# Altium footprint library PCB贴片元件封装库.pcblib: 366 footprints (part 13 of 23)
Each footprint in its own frame and in the unit in brackets; x right, y up, seen from the top. Pads: shape width x height; smd on the part's side, far side on the other; paste and mask are expansions set on the pad; w line width, h text height; cw(c..) or ccw(c..) is an arc to the next point about the centre after c.
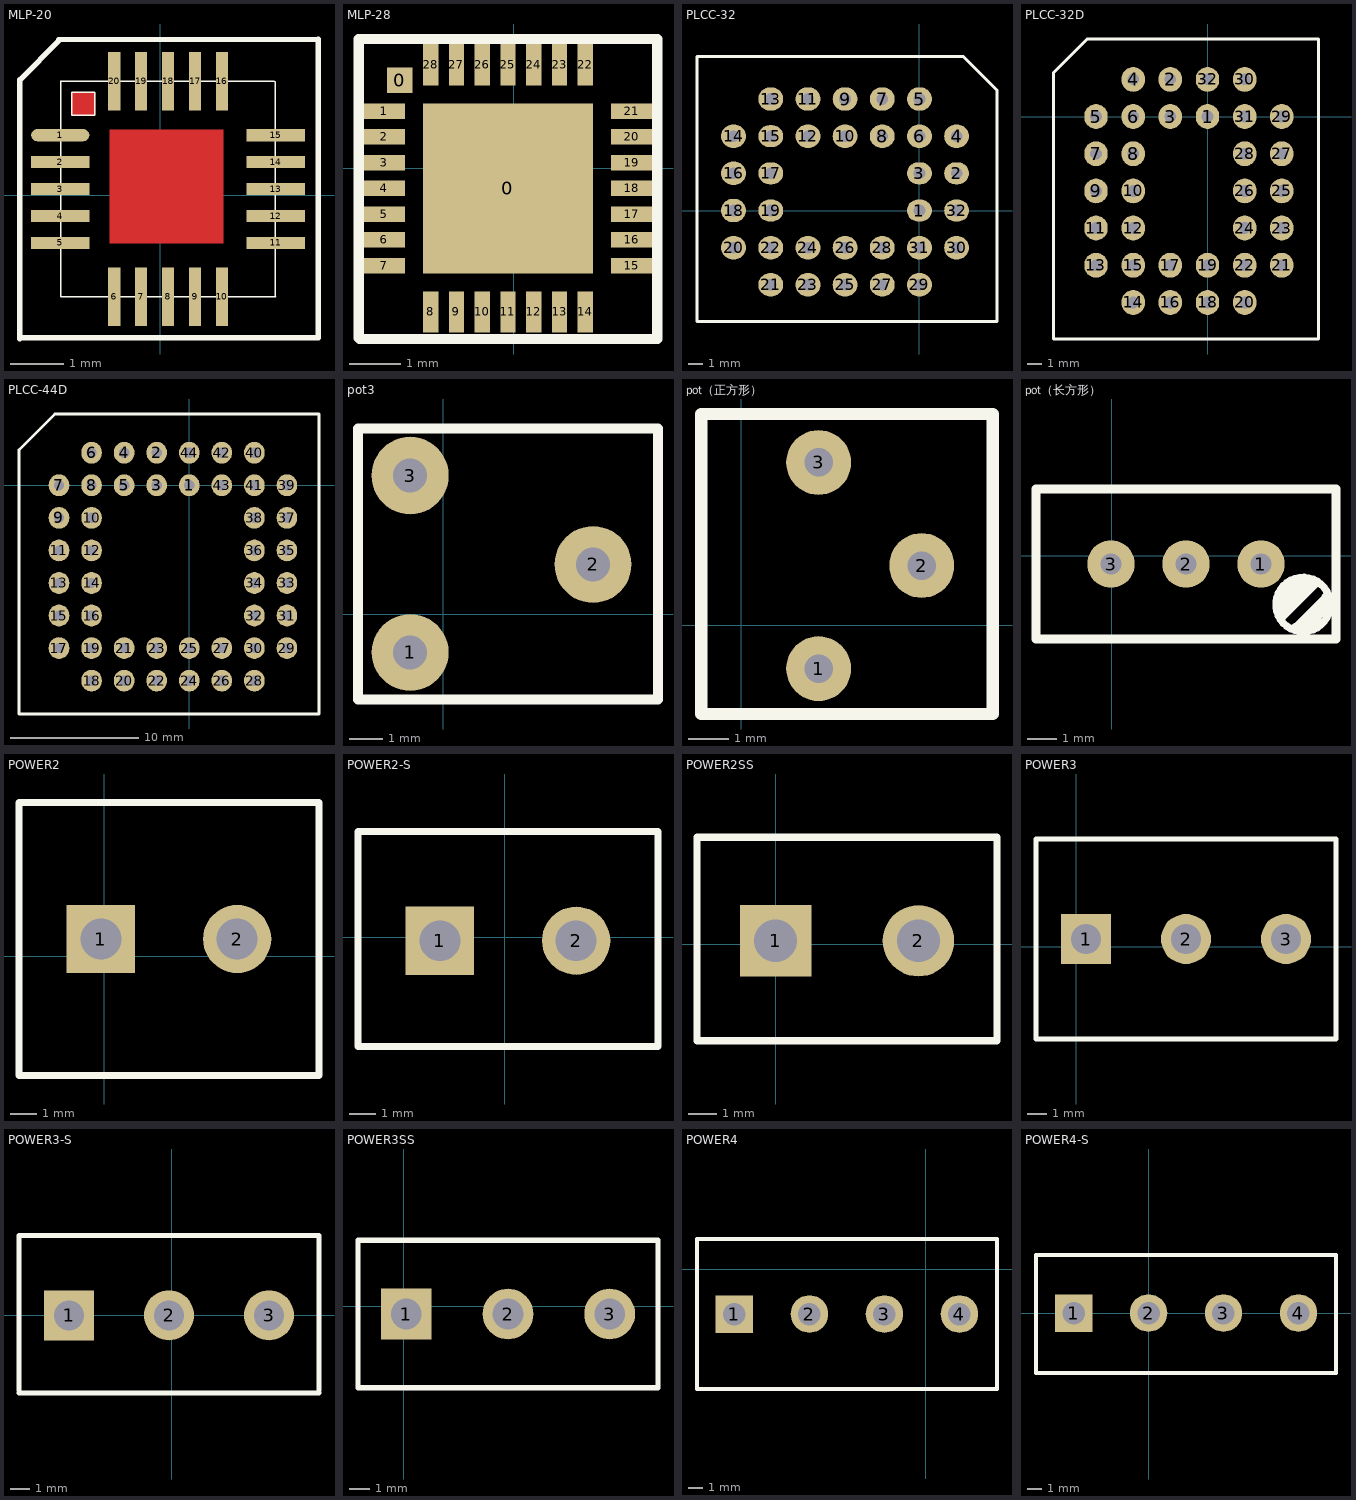
[diagram p12: the footprints below, top view; thin cyan lines are the x and y axes]

## MLP-20 [mm]
pads (20):
  oval 1.1x0.23 smd: 1(-1.88,1.137)
  rect 1.1x0.23 smd: 2(-1.88,0.629) 3(-1.88,0.121) 4(-1.88,-0.387) 5(-1.88,-0.895) 11(2.184,-0.895) 12(2.184,-0.387) 13(2.184,0.121) 14(2.184,0.629) 15(2.184,1.137)
  rect 0.23x1.1 smd: 6(-0.864,-1.911) 7(-0.356,-1.911) 8(0.152,-1.911) 9(0.66,-1.911) 10(1.168,-1.911) 16(1.168,2.153) 17(0.66,2.153) 18(0.152,2.153) 19(-0.356,2.153) 20(-0.864,2.153)
TopLayer:
  region: -0.954,1.241 -0.954,-0.909 1.196,-0.909 1.196,1.241
  rectangle: -1.677,1.518 -1.22,1.95
  lines w0.025: -2.642,-2.704 -2.621,-2.684 ; -1.894,2.929 -1.894,2.949 ; 2.97,2.939 2.981,2.949
TopOverlay:
  lines w0.025: -1.868,-1.907 -1.868,2.159 ; -1.862,-1.914 -1.859,-1.911 2.183,-1.911 2.17,-1.899 2.17,2.141 2.158,2.153 1.174,2.153 -1.863,2.153 -1.862,2.152 ; -1.665,1.948 -1.665,1.513 -1.23,1.513 ; -1.661,1.948 -1.226,1.948 -1.226,1.513
  lines w0.1: -2.642,-2.704 -2.642,2.149 ; -2.642,2.18 -1.894,2.929 ; -2.621,-2.684 2.981,-2.684 2.981,2.949 ; -1.914,2.939 2.97,2.939

## MLP-28 [mm]
pads (30):
  rect 0.5x0.5 smd: 0(-2.208,1.713)
  rect 3.3x3.3 smd: 0(-0.108,-0.387)
  rect 0.8x0.3 smd: 1(-2.508,1.113) 2(-2.508,0.613) 3(-2.508,0.113) 4(-2.508,-0.387) 5(-2.508,-0.887) 6(-2.508,-1.387) 7(-2.508,-1.887) 15(2.292,-1.887) 16(2.292,-1.387) 17(2.292,-0.887) 18(2.292,-0.387) 19(2.292,0.113) 20(2.292,0.613) 21(2.292,1.113)
  rect 0.3x0.8 smd: 8(-1.608,-2.787) 9(-1.108,-2.787) 10(-0.608,-2.787) 11(-0.108,-2.787) 12(0.392,-2.787) 13(0.892,-2.787) 14(1.392,-2.787) 22(1.392,2.013) 23(0.892,2.013) 24(0.392,2.013) 25(-0.108,2.013) 26(-0.608,2.013) 27(-1.108,2.013) 28(-1.608,2.013)
TopOverlay:
  lines w0.203: -3.008,-3.287 -3.008,2.513 2.792,2.513 2.792,-3.312 -2.983,-3.312

## PLCC-32 [mm]
pads (32):
  oval 1.7x1.5 hole 0.8: 1(0,0) 2(2.54,2.54) 3(0,2.54) 15(-10.16,5.08) 17(-10.16,2.54) 19(-10.16,0) 32(2.54,0)
  oval 1.7x1.6 hole 0.8: 4(2.54,5.08) 5(0,7.62) 6(0,5.08) 7(-2.54,7.62) 8(-2.54,5.08) 9(-5.08,7.62) 10(-5.08,5.08) 11(-7.62,7.62) 12(-7.62,5.08) 13(-10.16,7.62) 14(-12.7,5.08) 16(-12.7,2.54) 18(-12.7,0) 20(-12.7,-2.54) 21(-10.16,-5.08) 22(-10.16,-2.54) 23(-7.62,-5.08) 24(-7.62,-2.54) 25(-5.08,-5.08) 26(-5.08,-2.54) 27(-2.54,-5.08) 28(-2.54,-2.54) 29(0,-5.08) 30(2.54,-2.54) 31(0,-2.54)
TopOverlay:
  lines w0.2: -15.2,-7.58 -15.2,10.52 3,10.52 3.1,10.42 5.3,8.22 5.3,-7.58 -15.2,-7.58

## PLCC-32D [mm]
pads (32):
  oval 1.6x1.7 hole 0.8: 1(0,0) 2(-2.54,2.54) 3(-2.54,0) 4(-5.08,2.54) 5(-7.62,0) 6(-5.08,0) 7(-7.62,-2.54) 8(-5.08,-2.54) 9(-7.62,-5.08) 10(-5.08,-5.08) 11(-7.62,-7.62) 12(-5.08,-7.62) 13(-7.62,-10.16) 14(-5.08,-12.7) 15(-5.08,-10.16) 16(-2.54,-12.7) 17(-2.54,-10.16) 18(0,-12.7) 19(0,-10.16) 20(2.54,-12.7) 21(5.08,-10.16) 22(2.54,-10.16) 23(5.08,-7.62) 24(2.54,-7.62) 25(5.08,-5.08) 26(2.54,-5.08) 27(5.08,-2.54) 28(2.54,-2.54) 29(5.08,0) 30(2.54,2.54) 31(2.54,0) 32(0,2.54)
TopOverlay:
  lines w0.2: -10.52,-15.2 7.58,-15.2 7.58,5.3 -8.22,5.3 -10.42,3.1 -10.52,3 -10.52,-15.2

## PLCC-44D [mm]
pads (44):
  oval 1.6x1.7 hole 0.8: 1(0,0) 2(-2.54,2.54) 3(-2.54,0) 4(-5.08,2.54) 5(-5.08,0) 6(-7.62,2.54) 7(-10.16,0) 8(-7.62,0) 9(-10.16,-2.54) 10(-7.62,-2.54) 11(-10.16,-5.08) 12(-7.62,-5.08) 13(-10.16,-7.62) 14(-7.62,-7.62) 15(-10.16,-10.16) 16(-7.62,-10.16) 17(-10.16,-12.7) 18(-7.62,-15.24) 19(-7.62,-12.7) 20(-5.08,-15.24) 21(-5.08,-12.7) 22(-2.54,-15.24) 23(-2.54,-12.7) 24(0,-15.24) 25(0,-12.7) 26(2.54,-15.24) 27(2.54,-12.7) 28(5.08,-15.24) 29(7.62,-12.7) 30(5.08,-12.7) 31(7.62,-10.16) 32(5.08,-10.16) 33(7.62,-7.62) 34(5.08,-7.62) 35(7.62,-5.08) 36(5.08,-5.08) 37(7.62,-2.54) 38(5.08,-2.54) 39(7.62,0) 40(5.08,2.54) 41(5.08,0) 42(2.54,2.54) 43(2.54,0) 44(0,2.54)
TopOverlay:
  lines w0.2: -13.28,-17.84 10.12,-17.84 10.12,5.56 -10.48,5.56 -13.28,2.76 -13.28,-17.84

## pot3 [mil]
pads (3):
  round 90 hole 40: 1(-39,-45) 2(175,58)
  oval 90x91 hole 40: 3(-39,162)
TopOverlay:
  lines w12: -100,-100 251,-100 251,217 -100,217 -100,-100

## pot（正方形） [mm]
pads (3):
  round 1.6 hole 0.7: 1(1.905,-1.067) 2(4.445,1.473) 3(1.905,4.013)
TopOverlay:
  lines w0.305: -0.991,-2.184 -0.991,5.207 6.198,5.207 6.198,-2.184 -0.991,-2.184

## pot（长方形） [mm]
pads (3):
  round 1.6 hole 0.7: 1(5.055,-0.279) 2(2.515,-0.279) 3(-0.025,-0.279)
TopOverlay:
  circle w0.254: c6.477,-1.651 r0.916
  lines w0.254: 6.649,-2.241 6.813,-2.241 6.985,-2.413 ; 6.985,-0.889 6.477,-1.397 5.715,-2.159 5.715,-1.905 6.731,-0.889 6.223,-0.889 ; 7.033,-2.365 6.985,-2.413 ; 7.239,-1.397 6.223,-2.413 6.477,-2.413 ; 5.969,-1.143 6.223,-0.889 ; 5.969,-1.143 5.715,-1.397 5.715,-1.651 6.223,-1.143 ; 5.969,-1.143 6.223,-1.143 ; 6.223,-1.143 6.477,-1.143 6.223,-0.889 ; 6.223,-1.143 6.223,-0.889 ; 6.477,-2.413 6.985,-2.413 ; 6.477,-2.413 6.879,-2.011 7.033,-2.011 7.393,-1.651 7.393,-1.551 7.033,-1.911 6.979,-1.911 6.985,-1.917 6.985,-2.413
  lines w0.305: 7.595,-2.819 -2.565,-2.819 -2.565,2.261 7.595,2.261 7.595,-2.718

## POWER2 [mil]
pads (2):
  rect 100x100 hole 60: 1(-5,25)
  round 100 hole 60: 2(195,25)
TopOverlay:
  lines w10: -125,-175 -125,225 315,225 315,-175 -125,-175

## POWER2-S [mil]
pads (2):
  rect 100x100 hole 60: 1(-95,-5)
  round 100 hole 60: 2(105,-5)
TopOverlay:
  lines w10: -215,-160 225,-160 225,155 -215,155 -215,-160

## POWER2SS [mil]
pads (2):
  rect 100x100 hole 60: 1(0,5)
  round 100 hole 60: 2(200,5)
TopOverlay:
  lines w10: -110,-135 310,-135 310,150 -110,150 -110,-135

## POWER3 [mil]
pads (3):
  rect 100x100 hole 60: 1(20,15)
  round 100 hole 60: 2(220,15) 3(420,15)
TopOverlay:
  lines w10: -80,-185 -80,215 520,215 520,-185 -80,-185

## POWER3-S [mil]
pads (3):
  rect 100x100 hole 60: 1(-205,0)
  round 100 hole 60: 2(-5,0) 3(195,0)
TopOverlay:
  lines w10: -305,-155 295,-155 ; -305,-150 -305,160 295,160 295,-150

## POWER3SS [mil]
pads (3):
  rect 100x100 hole 60: 1(5,-15)
  round 100 hole 60: 2(205,-15) 3(405,-15)
TopOverlay:
  lines w10: -90,-160 500,-160 500,130 -90,130 -90,-160

## POWER4 [mil]
pads (4):
  rect 100x100 hole 60: 1(-510,-120)
  round 100 hole 60: 2(-310,-120) 3(-110,-120) 4(90,-120)
TopOverlay:
  lines w10: -610,-320 -610,80 190,80 190,-320 -610,-320

## POWER4-S [mil]
pads (4):
  rect 100x100 hole 60: 1(-200,0)
  round 100 hole 60: 2(0,0) 3(200,0) 4(400,0)
TopOverlay:
  lines w10: -300,-160 500,-160 500,155 -300,155 -300,-160